# Altium footprint library ADP_SMT.PcbLib: 204 footprints (part 7 of 15)
Each footprint in its own frame and in the unit in brackets; x right, y up, seen from the top. Pads: shape width x height; smd on the part's side, far side on the other; paste and mask are expansions set on the pad; w line width, h text height; cw(c..) or ccw(c..) is an arc to the next point about the centre after c.
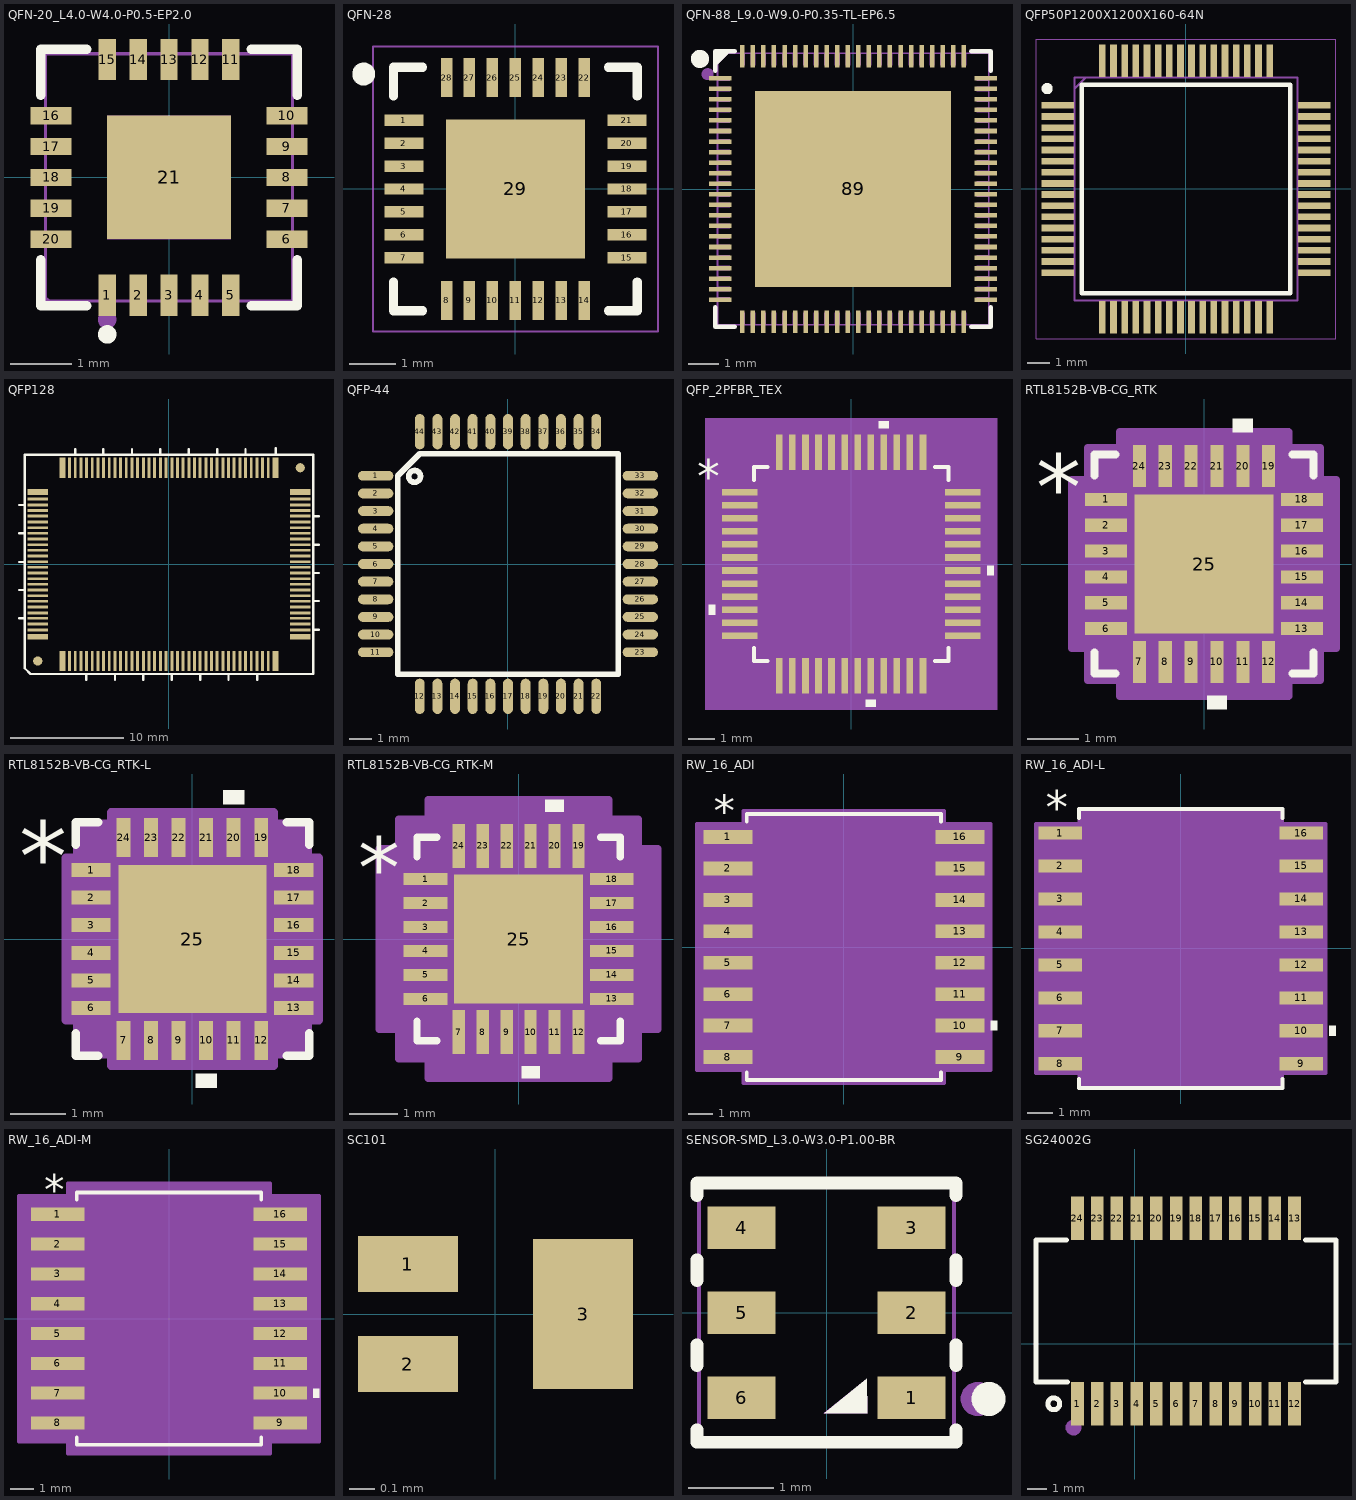
[diagram p6: the footprints below, top view; thin cyan lines are the x and y axes]

## QFN-20_L4.0-W4.0-P0.5-EP2.0 [mm]
pads (21):
  rect 0.28x0.665 smd: 1(-1,-1.908) 2(-0.5,-1.908) 3(0,-1.908) 4(0.5,-1.908) 5(1,-1.908) 11(1,1.908) 12(0.5,1.908) 13(0,1.908) 14(-0.5,1.908) 15(-1,1.908)
  rect 0.665x0.28 smd: 6(1.908,-1) 7(1.908,-0.5) 8(1.908,0) 9(1.908,0.5) 10(1.908,1) 16(-1.908,1) 17(-1.908,0.5) 18(-1.908,0) 19(-1.908,-0.5) 20(-1.908,-1)
  rect 2x2 smd: 21(0,0)
Top Overlay:
  circle w0.15: c-1,-2.54 r0.075
  lines w0.152: -2.076,-1.331 -2.076,-2.076 -1.331,-2.076 ; -2.076,1.331 -2.076,2.076 -1.331,2.076 ; 1.331,-2.076 2.076,-2.076 2.076,-1.331 ; 1.331,2.076 2.076,2.076 2.076,1.331
Mechanical 6:
  circle w0.15: c-1,-2.3 r0.075
Mechanical 15:
  region: -2.002,-0.9 -1.702,-0.9 -1.702,-1.1 -2.002,-1.1
  region: -2.002,-0.4 -1.702,-0.4 -1.702,-0.6 -2.002,-0.6
  region: -2.002,0.1 -1.702,0.1 -1.702,-0.1 -2.002,-0.1
  region: -2.002,0.6 -1.702,0.6 -1.702,0.4 -2.002,0.4
  region: -2.002,1.1 -1.702,1.1 -1.702,0.9 -2.002,0.9
  region: -1.1,2 -0.9,2 -0.9,1.7 -1.1,1.7
  region: -0.6,2 -0.4,2 -0.4,1.7 -0.6,1.7
  region: -0.1,2 0.1,2 0.1,1.7 -0.1,1.7
  region: 0.4,2 0.6,2 0.6,1.7 0.4,1.7
  region: 0.9,2 1.1,2 1.1,1.7 0.9,1.7
  region: 1.7,1.1 2,1.1 2,0.9 1.7,0.9
  region: 1.7,0.6 2,0.6 2,0.4 1.7,0.4
  region: 1.7,0.1 2,0.1 2,-0.1 1.7,-0.1
  region: 1.7,-0.4 2,-0.4 2,-0.6 1.7,-0.6
  region: 1.7,-0.9 2,-0.9 2,-1.1 1.7,-1.1
  region: 0.9,-1.7 1.1,-1.7 1.1,-2 0.9,-2
  region: 0.4,-1.7 0.6,-1.7 0.6,-2 0.4,-2
  region: -0.1,-1.7 0.1,-1.7 0.1,-2 -0.1,-2
  region: -0.6,-1.7 -0.4,-1.7 -0.4,-2 -0.6,-2
  region: -1.1,-1.7 -0.9,-1.7 -0.9,-2 -1.1,-2
  region: -1,1 1,1 1,-1 -1,-1
  region: -1.94,-2 -1.94,-1.975 -1.975,-1.94 -2.025,-1.94 -2.06,-1.975 -2.06,-2 -2.06,-2.025 -2.025,-2.06 -1.975,-2.06 -1.94,-2.025 -1.94,-2
  lines w0.051: -2.001,-1.998 1.999,-1.998 1.999,2.002 -2.001,2.002 -2.001,-1.998

## QFN-28 [mm] "QFN, 28-Leads, Body 5.00x5.00mm, Pitch 0.50mm, Thermal Pad 3.03x3.03mm, IPC Medium Density"
height 0.9
pads (29):
  rect 0.85x0.25 smd: 1(-2.425,1.5) 2(-2.425,1) 3(-2.425,0.5) 4(-2.425,0) 5(-2.425,-0.5) 6(-2.425,-1) 7(-2.425,-1.5) 15(2.425,-1.5) 16(2.425,-1) 17(2.425,-0.5) 18(2.425,0) 19(2.425,0.5) 20(2.425,1) 21(2.425,1.5)
  rect 0.25x0.85 smd: 8(-1.5,-2.425) 9(-1,-2.425) 10(-0.5,-2.425) 11(0,-2.425) 12(0.5,-2.425) 13(1,-2.425) 14(1.5,-2.425) 22(1.5,2.425) 23(1,2.425) 24(0.5,2.425) 25(0,2.425) 26(-0.5,2.425) 27(-1,2.425) 28(-1.5,2.425)
  rect 3.03x3.03 smd: 29(0,0)
Top Overlay:
  circle w0.25: c-3.3,2.5 r0.125
  lines w0.2: -2.65,-2.025 -2.65,-2.65 -2.025,-2.65 ; -2.65,2.025 -2.65,2.65 -2.025,2.65 ; 2.025,-2.65 2.65,-2.65 2.65,-2.025 ; 2.025,2.65 2.65,2.65 2.65,2.025
Mechanical 15:
  lines w0.05: -3.1,-3.1 -3.1,3.1 3.1,3.1 3.1,-3.1 -3.1,-3.1
  lines w0.1: -0.5,0 0.5,0 ; 0,-0.5 0,0.5
3D body "User Library-QFN28.STEP": height 0.9, standoff 0, extent -2.5,-2.525 2.54,2.515

## QFN-88_L9.0-W9.0-P0.35-TL-EP6.5 [mm]
pads (89):
  rect 0.74x0.15 smd paste-100 mask+0.051: 1(-4.407,3.675) 2(-4.407,3.325) 3(-4.407,2.975) 4(-4.407,2.625) 5(-4.407,2.275) 6(-4.407,1.925) 7(-4.407,1.575) 8(-4.407,1.225) 9(-4.407,0.875) 10(-4.407,0.525) 11(-4.407,0.175) 12(-4.407,-0.175) 13(-4.407,-0.525) 14(-4.407,-0.875) 15(-4.407,-1.225) 16(-4.407,-1.575) 17(-4.407,-1.925) 18(-4.407,-2.275) 19(-4.407,-2.625) 20(-4.407,-2.975) 21(-4.407,-3.325) 22(-4.407,-3.675) 45(4.407,-3.675) 46(4.407,-3.325) 47(4.407,-2.975) 48(4.407,-2.625) 49(4.407,-2.275) 50(4.407,-1.925) 51(4.407,-1.575) 52(4.407,-1.225) 53(4.407,-0.875) 54(4.407,-0.525) 55(4.407,-0.175) 56(4.407,0.175) 57(4.407,0.525) 58(4.407,0.875) 59(4.407,1.225) 60(4.407,1.575) 61(4.407,1.925) 62(4.407,2.275) 63(4.407,2.625) 64(4.407,2.975) 65(4.407,3.325) 66(4.407,3.675)
  rect 0.15x0.74 smd paste-100 mask+0.051: 23(-3.675,-4.407) 24(-3.325,-4.407) 25(-2.975,-4.407) 26(-2.625,-4.407) 27(-2.275,-4.407) 28(-1.925,-4.407) 29(-1.575,-4.407) 30(-1.225,-4.407) 31(-0.875,-4.407) 32(-0.525,-4.407) 33(-0.175,-4.407) 34(0.175,-4.407) 35(0.525,-4.407) 36(0.875,-4.407) 37(1.225,-4.407) 38(1.575,-4.407) 39(1.925,-4.407) 40(2.275,-4.407) 41(2.625,-4.407) 42(2.975,-4.407) 43(3.325,-4.407) 44(3.675,-4.407) 67(3.675,4.407) 68(3.325,4.407) 69(2.975,4.407) 70(2.625,4.407) 71(2.275,4.407) 72(1.925,4.407) 73(1.575,4.407) 74(1.225,4.407) 75(0.875,4.407) 76(0.525,4.407) 77(0.175,4.407) 78(-0.175,4.407) 79(-0.525,4.407) 80(-0.875,4.407) 81(-1.225,4.407) 82(-1.575,4.407) 83(-1.925,4.407) 84(-2.275,4.407) 85(-2.625,4.407) 86(-2.975,4.407) 87(-3.325,4.407) 88(-3.675,4.407)
  rect 6.5x6.5 smd paste-100 mask+0.051: 89(0,0)
Top Overlay:
  circle w0.4: c-5.08,4.318 r0.1
  region: -4.576,4.576 -4.576,4.064 -4.064,4.576
  lines w0.152: -4.576,-3.925 -4.576,-4.576 -3.925,-4.576 ; -4.576,3.925 -4.576,4.576 -3.925,4.576 ; 3.925,-4.576 4.576,-4.576 4.576,-3.925 ; 3.925,4.576 4.576,4.576 4.576,3.925
Top Paste:
  drawing of 89 lines, arcs and shapes, not listed
Mechanical 6:
  circle w0.2: c-4.826,3.81 r0.1
  region: -4.572,4.572 -4.572,4.064 -4.064,4.572
Mechanical 15:
  drawing of 94 lines, arcs and shapes, not listed

## QFP50P1200X1200X160-64N [mm]
height 3
pads (64):
  rect 1.45x0.3 smd: 1(-5.75,3.75) 2(-5.75,3.25) 3(-5.75,2.75) 4(-5.75,2.25) 5(-5.75,1.75) 6(-5.75,1.25) 7(-5.75,0.75) 8(-5.75,0.25) 9(-5.75,-0.25) 10(-5.75,-0.75) 11(-5.75,-1.25) 12(-5.75,-1.75) 13(-5.75,-2.25) 14(-5.75,-2.75) 15(-5.75,-3.25) 16(-5.75,-3.75) 33(5.75,-3.75) 34(5.75,-3.25) 35(5.75,-2.75) 36(5.75,-2.25) 37(5.75,-1.75) 38(5.75,-1.25) 39(5.75,-0.75) 40(5.75,-0.25) 41(5.75,0.25) 42(5.75,0.75) 43(5.75,1.25) 44(5.75,1.75) 45(5.75,2.25) 46(5.75,2.75) 47(5.75,3.25) 48(5.75,3.75)
  rect 0.3x1.45 smd: 17(-3.75,-5.75) 18(-3.25,-5.75) 19(-2.75,-5.75) 20(-2.25,-5.75) 21(-1.75,-5.75) 22(-1.25,-5.75) 23(-0.75,-5.75) 24(-0.25,-5.75) 25(0.25,-5.75) 26(0.75,-5.75) 27(1.25,-5.75) 28(1.75,-5.75) 29(2.25,-5.75) 30(2.75,-5.75) 31(3.25,-5.75) 32(3.75,-5.75) 49(3.75,5.75) 50(3.25,5.75) 51(2.75,5.75) 52(2.25,5.75) 53(1.75,5.75) 54(1.25,5.75) 55(0.75,5.75) 56(0.25,5.75) 57(-0.25,5.75) 58(-0.75,5.75) 59(-1.25,5.75) 60(-1.75,5.75) 61(-2.25,5.75) 62(-2.75,5.75) 63(-3.25,5.75) 64(-3.75,5.75)
Top Overlay:
  circle w0.25: c-6.225,4.5 r0.125
  lines w0.2: -4.675,-4.675 4.675,-4.675 4.675,4.675 -4.675,4.675 -4.675,-4.675
Mechanical 13:
  lines w0.1: -5,4.5 -4.5,5 ; -5,-5 5,-5 5,5 -5,5 -5,-5
Mechanical 15:
  lines w0.05: -6.725,-6.725 6.725,-6.725 6.725,6.725 -6.725,6.725 -6.725,-6.725
3D body "STM32F401RBT6.stp": height 1.6, standoff 0, extent -6,-6 6,6

## QFP128 [mil]
pads (130):
  rect 20x70 smd: 1(-369,-335) 38(369,-335) 65(369,335) 102(-369,335)
  rect 10x70 smd: 2(-345,-335) 3(-325,-335) 4(-305,-335) 5(-286,-335) 6(-266,-335) 7(-246,-335) 8(-227,-335) 9(-207,-335) 10(-187,-335) 11(-168,-335) 12(-148,-335) 13(-128,-335) 14(-109,-335) 15(-89,-335) 16(-69,-335) 17(-50,-335) 18(-30,-335) 19(-10,-335) 20(10,-335) 21(29,-335) 22(49,-335) 23(69,-335) 24(88,-335) 25(108,-335) 26(128,-335) 27(147,-335) 28(167,-335) 29(187,-335) 30(206,-335) 31(226,-335) 32(246,-335) 33(265,-335) 34(285,-335) 35(305,-335) 36(324,-335) 37(344,-335) 66(344,335) 67(324,335) 68(305,335) 69(285,335) 70(265,335) 71(246,335) 72(226,335) 73(206,335) 74(187,335) 75(167,335) 76(147,335) 77(128,335) 78(108,335) 79(88,335) 80(69,335) 81(49,335) 82(29,335) 83(10,335) 84(-10,335) 85(-30,335) 86(-50,335) 87(-69,335) 88(-89,335) 89(-109,335) 90(-128,335) 91(-148,335) 92(-168,335) 93(-187,335) 94(-207,335) 95(-227,335) 96(-246,335) 97(-266,335) 98(-286,335) 99(-305,335) 100(-325,335) 101(-345,335)
  rect 70x20 smd: 39(455,-251) 64(455,251) 103(-455,251) 128(-455,-251)
  rect 70x10 smd: 40(455,-227) 41(455,-207) 42(455,-187) 43(455,-168) 44(455,-148) 45(455,-128) 46(455,-109) 47(455,-89) 48(455,-69) 49(455,-50) 50(455,-30) 51(455,-10) 52(455,9) 53(455,29) 54(455,49) 55(455,68) 56(455,88) 57(455,108) 58(455,127) 59(455,147) 60(455,167) 61(455,187) 62(455,206) 63(455,226) 104(-455,226) 105(-455,206) 106(-455,187) 107(-455,167) 108(-455,147) 109(-455,127) 110(-455,108) 111(-455,88) 112(-455,68) 113(-455,49) 114(-455,29) 115(-455,9) 116(-455,-10) 117(-455,-30) 118(-455,-50) 119(-455,-69) 120(-455,-89) 121(-455,-109) 122(-455,-128) 123(-455,-148) 124(-455,-168) 125(-455,-187) 126(-455,-207) 127(-455,-227)
  round 32 smd: 129(-455,-335) 130(455,335)
Top Overlay:
  lines w8: -520,-187 -500,-187 ; -520,-89 -500,-89 ; -520,8 -500,8 ; -520,108 -500,108 ; -520,205.5 -500,205.5 ; -325,380 -325,400 ; -287,-400 -287,-380 ; -227.5,380 -227.5,400 ; -187,-400 -187,-380 ; -128,380 -128,400 ; -89.5,-400 -89.5,-380 ; -30,380 -30,400 ; 10,-400 10,-380 ; 69,380 69,400 ; 108,-400 108,-380 ; 167.5,380 167.5,400 ; 206,-400 206,-380 ; 265,380 265,400 ; 305.5,-400 305.5,-380 ; 370,382.5 370,402.5 ; 500,-227 520,-227 ; 500,-127 520,-127 ; 500,-30 520,-30 ; 500,68 520,68 ; 500,167 520,167 ; -500,-360 -500,380 500,380 500,-380 -480,-380 -500,-360
3D body "User Library-QFP5-128.step": height 114.17, standoff 0, extent -457.39,-339.17 456,338

## QFP-44 [mm]
pads (44):
  oval 1.6x0.45 smd: 1(-6,4) 2(-6,3.2) 3(-6,2.4) 4(-6,1.6) 5(-6,0.8) 6(-6,0) 7(-6,-0.8) 8(-6,-1.6) 9(-6,-2.4) 10(-6,-3.2) 11(-6,-4) 23(6,-4) 24(6,-3.2) 25(6,-2.4) 26(6,-1.6) 27(6,-0.8) 28(6,0) 29(6,0.8) 30(6,1.6) 31(6,2.4) 32(6,3.2) 33(6,4)
  oval 0.45x1.6 smd: 12(-4,-6) 13(-3.2,-6) 14(-2.4,-6) 15(-1.6,-6) 16(-0.8,-6) 17(0,-6) 18(0.8,-6) 19(1.6,-6) 20(2.4,-6) 21(3.2,-6) 22(4,-6) 34(4,6) 35(3.2,6) 36(2.4,6) 37(1.6,6) 38(0.8,6) 39(0,6) 40(-0.8,6) 41(-1.6,6) 42(-2.4,6) 43(-3.2,6) 44(-4,6)
Top Overlay:
  circle w0.254: c-4.232,3.972 r0.267
  lines w0.254: -5,-5 -5,4 -4,5 5,5 5,-5 -5,-5
3D body: height 1.15, standoff 0, extent -4.484,3.489 -3.488,4.487
3D body "User Library-44 pin tqfp ic package.STEP": height 1.1, standoff -0.01, extent -5.975,-5.975 6.025,6.025

## QFP_2PFBR_TEX [mil]
pads (48):
  rect 53.5x10 smd paste+0 mask+0: 1(-168.25,108.3) 2(-168.25,88.61) 3(-168.25,68.92) 4(-168.25,49.23) 5(-168.25,29.54) 6(-168.25,9.85) 7(-168.25,-9.85) 8(-168.25,-29.54) 9(-168.25,-49.23) 10(-168.25,-68.92) 11(-168.25,-88.61) 12(-168.25,-108.3) 25(168.25,-108.3) 26(168.25,-88.61) 27(168.25,-68.92) 28(168.25,-49.23) 29(168.25,-29.54) 30(168.25,-9.85) 31(168.25,9.85) 32(168.25,29.54) 33(168.25,49.23) 34(168.25,68.92) 35(168.25,88.61) 36(168.25,108.3)
  rect 10x53.5 smd paste+0 mask+0: 13(-108.3,-168.25) 14(-88.61,-168.25) 15(-68.92,-168.25) 16(-49.23,-168.25) 17(-29.54,-168.25) 18(-9.85,-168.25) 19(9.85,-168.25) 20(29.54,-168.25) 21(49.23,-168.25) 22(68.92,-168.25) 23(88.61,-168.25) 24(108.3,-168.25) 37(108.3,168.25) 38(88.61,168.25) 39(68.92,168.25) 40(49.23,168.25) 41(29.54,168.25) 42(9.85,168.25) 43(-9.85,168.25) 44(-29.54,168.25) 45(-49.23,168.25) 46(-68.92,168.25) 47(-88.61,168.25) 48(-108.3,168.25)
Top Overlay:
  region: 56.73,205 41.73,205 41.73,215 56.73,215
  region: 205,-2.35 215,-2.35 215,-17.34 205,-17.34
  region: 37.03,-205 22.04,-205 22.04,-215 37.03,-215
  region: -205,-61.41 -215,-61.41 -215,-76.42 -205,-76.42
  lines w6: -146.5,-126.39 -146.5,-146.5 -126.39,-146.5 ; -146.5,126.39 -146.5,146.5 -126.39,146.5 ; 126.39,-146.5 146.5,-146.5 146.5,-126.39 ; 126.39,146.5 146.5,146.5 146.5,126.39
  text "*" at -232.5,108.14 h50
Mechanical 5:
  region: 220,-220 -220,-220 -220,220 220,220
Mechanical 13:
  drawing of 197 lines, arcs and shapes, not listed
  text "*" at -139,93.14 h50
Mechanical 15:
  region: -123.3,-151.5 -151.5,-151.5 -151.5,-123.3 -205,-123.3 -205,123.3 -151.5,123.3 -151.5,151.5 -123.3,151.5 -123.3,205 123.3,205 123.3,151.5 151.5,151.5 151.5,123.3 205,123.3 205,-123.3 151.5,-123.3 151.5,-151.5 123.3,-151.5 123.3,-205 -123.3,-205
  lines w6: -205,-123.3 -205,123.3 -151.5,123.3 -151.5,151.5 -123.3,151.5 -123.3,205 123.3,205 123.3,151.5 151.5,151.5 151.5,123.3 205,123.3 205,-123.3 151.5,-123.3 151.5,-151.5 123.3,-151.5 123.3,-205 -123.3,-205 -123.3,-151.5 -151.5,-151.5 -151.5,-123.3 -205,-123.3
3D body "QFP_2PFBR_TEX.step": height 47.09, standoff 0, extent -180.98,-180.98 180.99,180.99

## RTL8152B-VB-CG_RTK [mil]
pads (25):
  rect 32x10 smd paste+0 mask+0: 1(-74.5,49.21) 2(-74.5,29.53) 3(-74.5,9.84) 4(-74.5,-9.84) 5(-74.5,-29.53) 6(-74.5,-49.21) 13(74.5,-49.21) 14(74.5,-29.53) 15(74.5,-9.84) 16(74.5,9.84) 17(74.5,29.53) 18(74.5,49.21)
  rect 10x32 smd paste+0 mask+0: 7(-49.21,-74.5) 8(-29.53,-74.5) 9(-9.84,-74.5) 10(9.84,-74.5) 11(29.53,-74.5) 12(49.21,-74.5) 19(49.21,74.5) 20(29.53,74.5) 21(9.84,74.5) 22(-9.84,74.5) 23(-29.53,74.5) 24(-49.21,74.5)
  rect 106x106 smd paste-53 mask+0: 25(0,0)
Top Overlay:
  region: 17.34,-100.5 2.34,-100.5 2.34,-110.5 17.34,-110.5
  region: 37.03,100.5 22.03,100.5 22.03,110.5 37.03,110.5
  lines w6: -83.5,-67.31 -83.5,-83.5 -67.31,-83.5 ; -83.5,67.31 -83.5,83.5 -67.31,83.5 ; 67.31,-83.5 83.5,-83.5 83.5,-67.31 ; 67.31,83.5 83.5,83.5 83.5,67.31
  text "*" at -128,34.06 h50
Top Paste:
  region: -3.94,49.06 -49.06,49.06 -49.06,3.94 -3.94,3.94
  region: -3.94,-3.94 -49.06,-3.94 -49.06,-49.06 -3.94,-49.06
  region: 49.06,49.06 3.94,49.06 3.94,3.94 49.06,3.94
  region: 49.06,-3.94 3.94,-3.94 3.94,-49.06 49.06,-49.06
Mechanical 13:
  lines w1: -78.5,28.5 -28.5,78.5 ; -78.5,-78.5 78.5,-78.5 78.5,78.5 -78.5,78.5 -78.5,-78.5 ; -78.5,-55.21 -78.5,-43.21 -78.5,-55.21 ; -78.5,-35.53 -78.5,-23.53 -78.5,-35.53 ; -78.5,-15.84 -78.5,-3.84 -78.5,-15.84 ; -78.5,3.84 -78.5,15.84 -78.5,3.84 ; -78.5,23.53 -78.5,35.53 -78.5,23.53 ; -78.5,43.21 -78.5,55.21 -78.5,43.21 ; -55.21,-78.5 -43.21,-78.5 -55.21,-78.5 ; -55.21,78.5 -43.21,78.5 -55.21,78.5 ; -35.53,-78.5 -23.53,-78.5 -35.53,-78.5 ; -35.53,78.5 -23.53,78.5 -35.53,78.5 ; -15.84,-78.5 -3.84,-78.5 -15.84,-78.5 ; -15.84,78.5 -3.84,78.5 -15.84,78.5 ; 3.84,-78.5 15.84,-78.5 3.84,-78.5 ; 3.84,78.5 15.84,78.5 3.84,78.5 ; 23.53,-78.5 35.53,-78.5 23.53,-78.5 ; 23.53,78.5 35.53,78.5 23.53,78.5 ; 43.21,-78.5 55.21,-78.5 43.21,-78.5 ; 43.21,78.5 55.21,78.5 43.21,78.5 ; 78.5,-55.21 78.5,-43.21 78.5,-55.21 ; 78.5,-35.53 78.5,-23.53 78.5,-35.53 ; 78.5,-15.84 78.5,-3.84 78.5,-15.84 ; 78.5,3.84 78.5,15.84 78.5,3.84 ; 78.5,23.53 78.5,35.53 78.5,23.53 ; 78.5,43.21 78.5,55.21 78.5,43.21
  text "*" at -71,34.06 h50
Mechanical 15:
  region: -64.21,-88.5 -88.5,-88.5 -88.5,-64.21 -100.5,-64.21 -100.5,64.21 -88.5,64.21 -88.5,88.5 -64.21,88.5 -64.21,100.5 64.21,100.5 64.21,88.5 88.5,88.5 88.5,64.21 100.5,64.21 100.5,-64.21 88.5,-64.21 88.5,-88.5 64.21,-88.5 64.21,-100.5 -64.21,-100.5
  lines w6: -100.5,-64.21 -88.5,-64.21 -88.5,-88.5 -64.21,-88.5 -64.21,-100.5 64.21,-100.5 64.21,-88.5 88.5,-88.5 88.5,-64.21 100.5,-64.21 100.5,64.21 88.5,64.21 88.5,88.5 64.21,88.5 64.21,100.5 -64.21,100.5 -64.21,88.5 -88.5,88.5 -88.5,64.21 -100.5,64.21 -100.5,-64.21
3D body "RTL8152B-VB-CG_RTK.step": height 35.12, standoff 0, extent -78.5,-78.5 78.5,78.5

## RTL8152B-VB-CG_RTK-L [mil]
pads (25):
  rect 28x10 smd paste+0 mask+0: 1(-72.5,49.21) 2(-72.5,29.53) 3(-72.5,9.84) 4(-72.5,-9.84) 5(-72.5,-29.53) 6(-72.5,-49.21) 13(72.5,-49.21) 14(72.5,-29.53) 15(72.5,-9.84) 16(72.5,9.84) 17(72.5,29.53) 18(72.5,49.21)
  rect 10x28 smd paste+0 mask+0: 7(-49.21,-72.5) 8(-29.53,-72.5) 9(-9.84,-72.5) 10(9.84,-72.5) 11(29.53,-72.5) 12(49.21,-72.5) 19(49.21,72.5) 20(29.53,72.5) 21(9.84,72.5) 22(-9.84,72.5) 23(-29.53,72.5) 24(-49.21,72.5)
  rect 106x106 smd paste-53 mask+0: 25(0,0)
Top Overlay:
  region: 17.34,-96.5 2.34,-96.5 2.34,-106.5 17.34,-106.5
  region: 37.03,96.5 22.03,96.5 22.03,106.5 37.03,106.5
  lines w6: -83.5,-67.31 -83.5,-83.5 -67.31,-83.5 ; -83.5,67.31 -83.5,83.5 -67.31,83.5 ; 67.31,-83.5 83.5,-83.5 83.5,-67.31 ; 67.31,83.5 83.5,83.5 83.5,67.31
  text "*" at -124,34.06 h50
Top Paste:
  region: -3.94,49.06 -49.06,49.06 -49.06,3.94 -3.94,3.94
  region: -3.94,-3.94 -49.06,-3.94 -49.06,-49.06 -3.94,-49.06
  region: 49.06,49.06 3.94,49.06 3.94,3.94 49.06,3.94
  region: 49.06,-3.94 3.94,-3.94 3.94,-49.06 49.06,-49.06
Mechanical 13:
  lines w1: -78.5,28.5 -28.5,78.5 ; -78.5,-78.5 78.5,-78.5 78.5,78.5 -78.5,78.5 -78.5,-78.5 ; -78.5,-55.21 -78.5,-43.21 -78.5,-55.21 ; -78.5,-35.53 -78.5,-23.53 -78.5,-35.53 ; -78.5,-15.84 -78.5,-3.84 -78.5,-15.84 ; -78.5,3.84 -78.5,15.84 -78.5,3.84 ; -78.5,23.53 -78.5,35.53 -78.5,23.53 ; -78.5,43.21 -78.5,55.21 -78.5,43.21 ; -55.21,-78.5 -43.21,-78.5 -55.21,-78.5 ; -55.21,78.5 -43.21,78.5 -55.21,78.5 ; -35.53,-78.5 -23.53,-78.5 -35.53,-78.5 ; -35.53,78.5 -23.53,78.5 -35.53,78.5 ; -15.84,-78.5 -3.84,-78.5 -15.84,-78.5 ; -15.84,78.5 -3.84,78.5 -15.84,78.5 ; 3.84,-78.5 15.84,-78.5 3.84,-78.5 ; 3.84,78.5 15.84,78.5 3.84,78.5 ; 23.53,-78.5 35.53,-78.5 23.53,-78.5 ; 23.53,78.5 35.53,78.5 23.53,78.5 ; 43.21,-78.5 55.21,-78.5 43.21,-78.5 ; 43.21,78.5 55.21,78.5 43.21,78.5 ; 78.5,-55.21 78.5,-43.21 78.5,-55.21 ; 78.5,-35.53 78.5,-23.53 78.5,-35.53 ; 78.5,-15.84 78.5,-3.84 78.5,-15.84 ; 78.5,3.84 78.5,15.84 78.5,3.84 ; 78.5,23.53 78.5,35.53 78.5,23.53 ; 78.5,43.21 78.5,55.21 78.5,43.21
  text "*" at -71,34.06 h50
Mechanical 15:
  region: -58.21,-82.5 -82.5,-82.5 -82.5,-58.21 -90.5,-58.21 -90.5,58.21 -82.5,58.21 -82.5,82.5 -58.21,82.5 -58.21,90.5 58.21,90.5 58.21,82.5 82.5,82.5 82.5,58.21 90.5,58.21 90.5,-58.21 82.5,-58.21 82.5,-82.5 58.21,-82.5 58.21,-90.5 -58.21,-90.5
  lines w6: -90.5,-58.21 -82.5,-58.21 -82.5,-82.5 -58.21,-82.5 -58.21,-90.5 58.21,-90.5 58.21,-82.5 82.5,-82.5 82.5,-58.21 90.5,-58.21 90.5,58.21 82.5,58.21 82.5,82.5 58.21,82.5 58.21,90.5 -58.21,90.5 -58.21,82.5 -82.5,82.5 -82.5,58.21 -90.5,58.21 -90.5,-58.21
3D body "RTL8152B-VB-CG_RTK.step": height 35.12, standoff 0, extent -78.5,-78.5 78.5,78.5

## RTL8152B-VB-CG_RTK-M [mil]
pads (25):
  rect 36x10 smd paste+0 mask+0: 1(-76.5,49.21) 2(-76.5,29.53) 3(-76.5,9.84) 4(-76.5,-9.84) 5(-76.5,-29.53) 6(-76.5,-49.21) 13(76.5,-49.21) 14(76.5,-29.53) 15(76.5,-9.84) 16(76.5,9.84) 17(76.5,29.53) 18(76.5,49.21)
  rect 10x36 smd paste+0 mask+0: 7(-49.21,-76.5) 8(-29.53,-76.5) 9(-9.84,-76.5) 10(9.84,-76.5) 11(29.53,-76.5) 12(49.21,-76.5) 19(49.21,76.5) 20(29.53,76.5) 21(9.84,76.5) 22(-9.84,76.5) 23(-29.53,76.5) 24(-49.21,76.5)
  rect 106x106 smd paste-53 mask+0: 25(0,0)
Top Overlay:
  region: 37.03,104.5 22.03,104.5 22.03,114.5 37.03,114.5
  region: 17.34,-104.5 2.34,-104.5 2.34,-114.5 17.34,-114.5
  lines w6: -83.5,-67.31 -83.5,-83.5 -67.31,-83.5 ; -83.5,67.31 -83.5,83.5 -67.31,83.5 ; 67.31,-83.5 83.5,-83.5 83.5,-67.31 ; 67.31,83.5 83.5,83.5 83.5,67.31
  text "*" at -132,34.06 h50
Top Paste:
  region: 49.06,-3.94 3.94,-3.94 3.94,-49.06 49.06,-49.06
  region: 49.06,49.06 3.94,49.06 3.94,3.94 49.06,3.94
  region: -3.94,-3.94 -49.06,-3.94 -49.06,-49.06 -3.94,-49.06
  region: -3.94,49.06 -49.06,49.06 -49.06,3.94 -3.94,3.94
Mechanical 13:
  lines w1: -78.5,28.5 -28.5,78.5 ; -78.5,-78.5 -78.5,78.5 78.5,78.5 78.5,-78.5 -78.5,-78.5 ; -78.5,-55.21 -78.5,-43.21 -78.5,-55.21 ; -78.5,-35.53 -78.5,-23.53 -78.5,-35.53 ; -78.5,-15.84 -78.5,-3.84 -78.5,-15.84 ; -78.5,3.84 -78.5,15.84 -78.5,3.84 ; -78.5,23.53 -78.5,35.53 -78.5,23.53 ; -78.5,43.21 -78.5,55.21 -78.5,43.21 ; -55.21,-78.5 -43.21,-78.5 -55.21,-78.5 ; -55.21,78.5 -43.21,78.5 -55.21,78.5 ; -35.53,-78.5 -23.53,-78.5 -35.53,-78.5 ; -35.53,78.5 -23.53,78.5 -35.53,78.5 ; -15.84,-78.5 -3.84,-78.5 -15.84,-78.5 ; -15.84,78.5 -3.84,78.5 -15.84,78.5 ; 3.84,-78.5 15.84,-78.5 3.84,-78.5 ; 3.84,78.5 15.84,78.5 3.84,78.5 ; 23.53,-78.5 35.53,-78.5 23.53,-78.5 ; 23.53,78.5 35.53,78.5 23.53,78.5 ; 43.21,-78.5 55.21,-78.5 43.21,-78.5 ; 43.21,78.5 55.21,78.5 43.21,78.5 ; 78.5,-55.21 78.5,-43.21 78.5,-55.21 ; 78.5,-35.53 78.5,-23.53 78.5,-35.53 ; 78.5,-15.84 78.5,-3.84 78.5,-15.84 ; 78.5,3.84 78.5,15.84 78.5,3.84 ; 78.5,23.53 78.5,35.53 78.5,23.53 ; 78.5,43.21 78.5,55.21 78.5,43.21
  text "*" at -71,34.06 h50
Mechanical 15:
  region: -74.21,-98.5 -98.5,-98.5 -98.5,-74.21 -114.5,-74.21 -114.5,74.21 -98.5,74.21 -98.5,98.5 -74.21,98.5 -74.21,114.5 74.21,114.5 74.21,98.5 98.5,98.5 98.5,74.21 114.5,74.21 114.5,-74.21 98.5,-74.21 98.5,-98.5 74.21,-98.5 74.21,-114.5 -74.21,-114.5
  lines w6: -114.5,-74.21 -114.5,74.21 -98.5,74.21 -98.5,98.5 -74.21,98.5 -74.21,114.5 74.21,114.5 74.21,98.5 98.5,98.5 98.5,74.21 114.5,74.21 114.5,-74.21 98.5,-74.21 98.5,-98.5 74.21,-98.5 74.21,-114.5 -74.21,-114.5 -74.21,-98.5 -98.5,-98.5 -98.5,-74.21 -114.5,-74.21
3D body "RTL8152B-VB-CG_RTK.step": height 35.12, standoff 0, extent -78.5,-78.5 78.5,78.5

## RW_16_ADI [mil]
pads (16):
  rect 78x22 smd paste+0 mask+0: 1(-184.5,175) 2(-184.5,125) 3(-184.5,75) 4(-184.5,25) 5(-184.5,-25) 6(-184.5,-75) 7(-184.5,-125) 8(-184.5,-175) 9(184.5,-175) 10(184.5,-125) 11(184.5,-75) 12(184.5,-25) 13(184.5,25) 14(184.5,75) 15(184.5,125) 16(184.5,175)
Top Overlay:
  region: 233.5,-117.5 243.5,-117.5 243.5,-132.5 233.5,-132.5
  lines w6: -154.5,-199.1 -154.5,-211.5 154.5,-211.5 154.5,-199.1 ; -154.5,199.1 -154.5,211.5 154.5,211.5 154.5,199.1
  text "*" at -207,192 h50
Mechanical 13:
  lines w0: -12,206.5 ccw(c0,206.5) 12,206.5
  lines w1: -209.5,-185 -209.5,-165 -149.5,-165 -149.5,-185 -209.5,-185 ; -209.5,-135 -209.5,-115 -149.5,-115 -149.5,-135 -209.5,-135 ; -209.5,-85 -209.5,-65 -149.5,-65 -149.5,-85 -209.5,-85 ; -209.5,-35 -209.5,-15 -149.5,-15 -149.5,-35 -209.5,-35 ; -209.5,15 -209.5,35 -149.5,35 -149.5,15 -209.5,15 ; -209.5,65 -209.5,85 -149.5,85 -149.5,65 -209.5,65 ; -209.5,115 -209.5,135 -149.5,135 -149.5,115 -209.5,115 ; -209.5,165 -209.5,185 -149.5,185 -149.5,165 -209.5,165 ; -149.5,-206.5 149.5,-206.5 149.5,206.5 -149.5,206.5 -149.5,-206.5 ; 149.5,-185 149.5,-165 209.5,-165 209.5,-185 149.5,-185 ; 149.5,-135 149.5,-115 209.5,-115 209.5,-135 149.5,-135 ; 149.5,-85 149.5,-65 209.5,-65 209.5,-85 149.5,-85 ; 149.5,-35 149.5,-15 209.5,-15 209.5,-35 149.5,-35 ; 149.5,15 149.5,35 209.5,35 209.5,15 149.5,15 ; 149.5,65 149.5,85 209.5,85 209.5,65 149.5,65 ; 149.5,115 149.5,135 209.5,135 209.5,115 149.5,115 ; 149.5,165 149.5,185 209.5,185 209.5,165 149.5,165
  text "*" at -147,153.5 h50
Mechanical 15:
  region: -159.5,-196 -233.5,-196 -233.5,196 -159.5,196 -159.5,216.5 159.5,216.5 159.5,196 233.5,196 233.5,-196 159.5,-196 159.5,-216.5 -159.5,-216.5
  lines w6: -233.5,-196 -233.5,196 -159.5,196 -159.5,216.5 159.5,216.5 159.5,196 233.5,196 233.5,-196 159.5,-196 159.5,-216.5 -159.5,-216.5 -159.5,-196 -233.5,-196
3D body "RW_16_ADI.step": height 104.09, standoff 0, extent -209.49,-206.5 209.49,206.5

## RW_16_ADI-L [mil]
pads (16):
  rect 66x20 smd paste+0 mask+0: 1(-182.5,175) 2(-182.5,125) 3(-182.5,75) 4(-182.5,25) 5(-182.5,-25) 6(-182.5,-75) 7(-182.5,-125) 8(-182.5,-175) 9(182.5,-175) 10(182.5,-125) 11(182.5,-75) 12(182.5,-25) 13(182.5,25) 14(182.5,75) 15(182.5,125) 16(182.5,175)
Top Overlay:
  region: 225.5,-117.5 235.5,-117.5 235.5,-132.5 225.5,-132.5
  lines w6: -154.5,-198.1 -154.5,-211.5 154.5,-211.5 154.5,-198.1 ; -154.5,198.1 -154.5,211.5 154.5,211.5 154.5,198.1
  text "*" at -205,190 h50
Mechanical 13:
  lines w0: -12,206.5 ccw(c0,206.5) 12,206.5
  lines w1: -209.5,-185 -149.5,-185 -149.5,-165 -209.5,-165 -209.5,-185 ; -209.5,-135 -149.5,-135 -149.5,-115 -209.5,-115 -209.5,-135 ; -209.5,-85 -149.5,-85 -149.5,-65 -209.5,-65 -209.5,-85 ; -209.5,-35 -149.5,-35 -149.5,-15 -209.5,-15 -209.5,-35 ; -209.5,15 -149.5,15 -149.5,35 -209.5,35 -209.5,15 ; -209.5,65 -149.5,65 -149.5,85 -209.5,85 -209.5,65 ; -209.5,115 -149.5,115 -149.5,135 -209.5,135 -209.5,115 ; -209.5,165 -149.5,165 -149.5,185 -209.5,185 -209.5,165 ; -149.5,-206.5 -149.5,206.5 149.5,206.5 149.5,-206.5 -149.5,-206.5 ; 149.5,-185 209.5,-185 209.5,-165 149.5,-165 149.5,-185 ; 149.5,-135 209.5,-135 209.5,-115 149.5,-115 149.5,-135 ; 149.5,-85 209.5,-85 209.5,-65 149.5,-65 149.5,-85 ; 149.5,-35 209.5,-35 209.5,-15 149.5,-15 149.5,-35 ; 149.5,15 209.5,15 209.5,35 149.5,35 149.5,15 ; 149.5,65 209.5,65 209.5,85 149.5,85 149.5,65 ; 149.5,115 209.5,115 209.5,135 149.5,135 149.5,115 ; 149.5,165 209.5,165 209.5,185 149.5,185 149.5,165
  text "*" at -147,153.5 h50
Mechanical 15:
  region: -153.5,-189 -219.5,-189 -219.5,189 -153.5,189 -153.5,210.5 153.5,210.5 153.5,189 219.5,189 219.5,-189 153.5,-189 153.5,-210.5 -153.5,-210.5
  lines w6: -219.5,-189 -153.5,-189 -153.5,-210.5 153.5,-210.5 153.5,-189 219.5,-189 219.5,189 153.5,189 153.5,210.5 -153.5,210.5 -153.5,189 -219.5,189 -219.5,-189
3D body "RW_16_ADI.step": height 104.09, standoff 0, extent -209.49,-206.5 209.49,206.5

## RW_16_ADI-M [mil]
pads (16):
  rect 90x22 smd paste+0 mask+0: 1(-186.5,175) 2(-186.5,125) 3(-186.5,75) 4(-186.5,25) 5(-186.5,-25) 6(-186.5,-75) 7(-186.5,-125) 8(-186.5,-175) 9(186.5,-175) 10(186.5,-125) 11(186.5,-75) 12(186.5,-25) 13(186.5,25) 14(186.5,75) 15(186.5,125) 16(186.5,175)
Top Overlay:
  region: 241.5,-117.5 251.5,-117.5 251.5,-132.5 241.5,-132.5
  lines w6: -154.5,-199.1 -154.5,-211.5 154.5,-211.5 154.5,-199.1 ; -154.5,199.1 -154.5,211.5 154.5,211.5 154.5,199.1
  text "*" at -209,192 h50
Mechanical 13:
  lines w0: -12,206.5 ccw(c0,206.5) 12,206.5
  lines w1: -209.5,-185 -149.5,-185 -149.5,-165 -209.5,-165 -209.5,-185 ; -209.5,-135 -149.5,-135 -149.5,-115 -209.5,-115 -209.5,-135 ; -209.5,-85 -149.5,-85 -149.5,-65 -209.5,-65 -209.5,-85 ; -209.5,-35 -149.5,-35 -149.5,-15 -209.5,-15 -209.5,-35 ; -209.5,15 -149.5,15 -149.5,35 -209.5,35 -209.5,15 ; -209.5,65 -149.5,65 -149.5,85 -209.5,85 -209.5,65 ; -209.5,115 -149.5,115 -149.5,135 -209.5,135 -209.5,115 ; -209.5,165 -149.5,165 -149.5,185 -209.5,185 -209.5,165 ; -149.5,-206.5 -149.5,206.5 149.5,206.5 149.5,-206.5 -149.5,-206.5 ; 149.5,-185 209.5,-185 209.5,-165 149.5,-165 149.5,-185 ; 149.5,-135 209.5,-135 209.5,-115 149.5,-115 149.5,-135 ; 149.5,-85 209.5,-85 209.5,-65 149.5,-65 149.5,-85 ; 149.5,-35 209.5,-35 209.5,-15 149.5,-15 149.5,-35 ; 149.5,15 209.5,15 209.5,35 149.5,35 149.5,15 ; 149.5,65 209.5,65 209.5,85 149.5,85 149.5,65 ; 149.5,115 209.5,115 209.5,135 149.5,135 149.5,115 ; 149.5,165 209.5,165 209.5,185 149.5,185 149.5,165
  text "*" at -147,153.5 h50
Mechanical 15:
  region: -169.5,-206 -251.5,-206 -251.5,206 -169.5,206 -169.5,226.5 169.5,226.5 169.5,206 251.5,206 251.5,-206 169.5,-206 169.5,-226.5 -169.5,-226.5
  lines w6: -251.5,-206 -169.5,-206 -169.5,-226.5 169.5,-226.5 169.5,-206 251.5,-206 251.5,206 169.5,206 169.5,226.5 -169.5,226.5 -169.5,206 -251.5,206 -251.5,-206
3D body "RW_16_ADI.step": height 104.09, standoff 0, extent -209.49,-206.5 209.49,206.5

## SC101 [mm]
height 0.5
pads (3):
  rect 0.4x0.225 smd: 1(-0.35,0.2) 2(-0.35,-0.2)
  rect 0.4x0.6 smd: 3(0.35,0)
3D body "SC101.STEP": height 0.5, standoff 0, extent -0.519,-0.32 0.521,0.32

## SENSOR-SMD_L3.0-W3.0-P1.00-BR [mm]
pads (6):
  rect 0.8x0.5 smd paste+0 mask+0.05: 1(1,-1) 2(1,0) 3(1,1) 4(-1,1) 5(-1,0) 6(-1,-1)
Top Overlay:
  circle w0.2: c1.905,-1.016 r0.1
  region: -0.028,-1.186 0.481,-1.187 0.476,-0.78
  lines w0.15: -1.524,-1.378 -1.524,-1.524 1.524,-1.524 1.524,-1.378 ; -1.524,-0.622 -1.524,-0.378 ; -1.524,0.378 -1.524,0.622 ; -1.524,1.378 -1.524,1.524 1.524,1.524 1.524,1.378 ; 1.524,-0.622 1.524,-0.378 ; 1.524,0.378 1.524,0.622
Mechanical 6:
  circle w0.2: c1.778,-1.016 r0.1
  region: -0.032,-1.186 0.477,-1.187 0.472,-0.781
Mechanical 15:
  region: 1.275,0.8 0.725,0.8 0.725,1.2 1.275,1.2
  region: 1.275,-0.2 0.725,-0.2 0.725,0.2 1.275,0.2
  region: 1.275,-1.2 0.725,-1.2 0.725,-0.8 1.275,-0.8
  region: -0.725,-1.2 -1.275,-1.2 -1.275,-0.8 -0.725,-0.8
  region: -0.725,-0.2 -1.275,-0.2 -1.275,0.2 -0.725,0.2
  region: -0.725,0.8 -1.275,0.8 -1.275,1.2 -0.725,1.2
  region: 1.56,-1.5 1.559,-1.476 1.524,-1.443 1.476,-1.443 1.441,-1.476 1.44,-1.5 1.441,-1.524 1.476,-1.557 1.524,-1.557 1.559,-1.524 1.56,-1.5
  lines w0.051: -1.5,-1.5 1.5,-1.5 1.5,1.5 -1.5,1.5 -1.5,-1.5

## SG24002G [mm]
pads (24):
  rect 0.64x2.2 smd: 1(-2.899,-3.043) 2(-1.899,-3.043) 3(-0.899,-3.043) 4(0.101,-3.043) 5(1.101,-3.043) 6(2.101,-3.043) 7(3.101,-3.043) 8(4.101,-3.043) 9(5.101,-3.043) 10(6.101,-3.043) 11(7.101,-3.043) 12(8.101,-3.043) 13(8.101,6.357) 14(7.101,6.357) 15(6.101,6.357) 16(5.101,6.357) 17(4.101,6.357) 18(3.101,6.357) 19(2.101,6.357) 20(1.101,6.357) 21(0.101,6.357) 22(-0.899,6.357) 23(-1.899,6.357) 24(-2.899,6.357)
Top Overlay:
  circle w0.254: c-4.099,-3.043 r0.3
  lines w0.254: -3.45,5.257 -4.999,5.257 -4.999,-1.943 -3.399,-1.943 ; 8.652,-1.943 10.201,-1.943 10.201,5.257 8.652,5.257
Mechanical 15:
  circle w0.4: c-3.099,-4.243 r0.2